# Altium footprint library Samtec PC104 Plus.PcbLib: 38 footprints (part 3 of 3)
Each footprint in its own frame and in the unit in brackets; x right, y up, seen from the top. Pads: shape width x height; smd on the part's side, far side on the other; paste and mask are expansions set on the pad; w line width, h text height; cw(c..) or ccw(c..) is an arc to the next point about the centre after c.
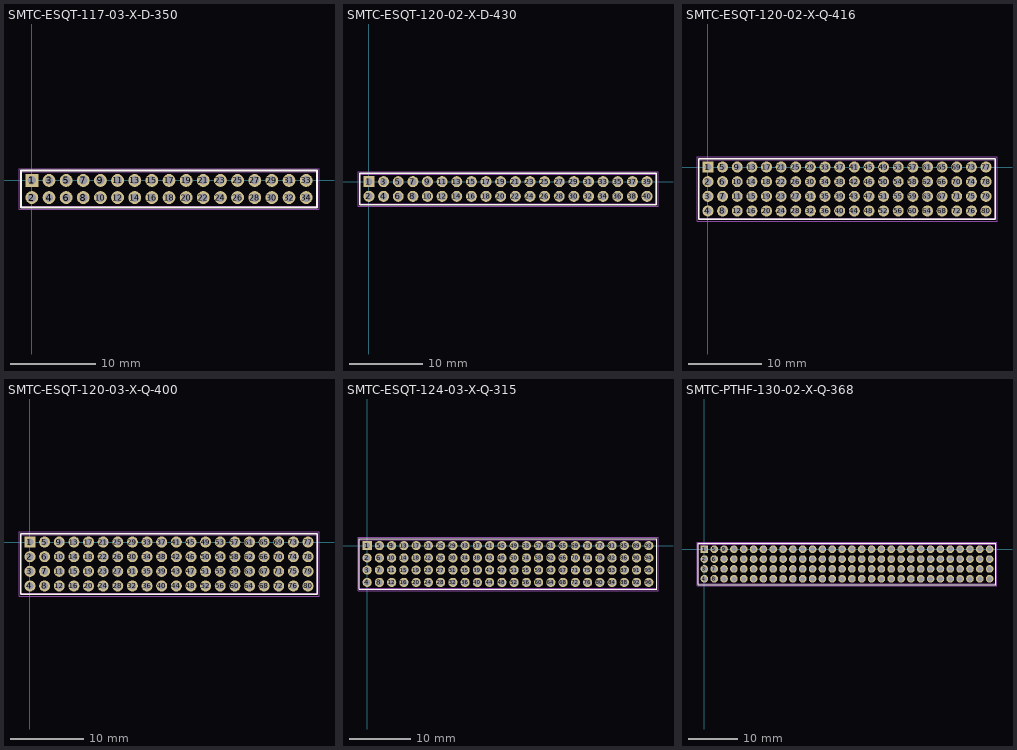
[diagram p2: the footprints below, top view; thin cyan lines are the x and y axes]

## SMTC-ESQT-117-03-X-D-350 [mm] "Flexible Elevated Socket, 2x17 Pins, Vertical, 2mm Pitch, Female"
height 10.36
pads (34):
  rect 1.5x1.5 hole 0.99: 1(0,0)
  round 1.5 hole 0.99: 2(0,-2) 3(2,0) 4(2,-2) 5(4,0) 6(4,-2) 7(6,0) 8(6,-2) 9(8,0) 10(8,-2) 11(10,0) 12(10,-2) 13(12,0) 14(12,-2) 15(14,0) 16(14,-2) 17(16,0) 18(16,-2) 19(18,0) 20(18,-2) 21(20,0) 22(20,-2) 23(22,0) 24(22,-2) 25(24,0) 26(24,-2) 27(26,0) 28(26,-2) 29(28,0) 30(28,-2) 31(30,0) 32(30,-2) 33(32,0) 34(32,-2)
Top Overlay:
  lines w0.2: -1.275,-3.15 -1.275,1.15 33.275,1.15 33.275,-3.15 -1.275,-3.15
Mechanical 13:
  lines w0.1: -1.275,-3 -1.275,1 33.275,1 33.275,-3 -1.275,-3
Mechanical 15:
  lines w0.05: -1.5,-3.375 33.5,-3.375 33.5,1.375 -1.5,1.375 -1.5,-3.375
3D body "ESQT-117-03-X-D-350.step": height 10.36, standoff -2.74, extent -1.149,-3 33.149,1

## SMTC-ESQT-120-02-X-D-430 [mm] "Flexible Elevated Socket, 2x20 Pins, Vertical, 2mm Pitch, Female"
height 20.32
pads (40):
  rect 1.5x1.5 hole 0.99: 1(0,0)
  round 1.5 hole 0.99: 2(0,-2) 3(2,0) 4(2,-2) 5(4,0) 6(4,-2) 7(6,0) 8(6,-2) 9(8,0) 10(8,-2) 11(10,0) 12(10,-2) 13(12,0) 14(12,-2) 15(14,0) 16(14,-2) 17(16,0) 18(16,-2) 19(18,0) 20(18,-2) 21(20,0) 22(20,-2) 23(22,0) 24(22,-2) 25(24,0) 26(24,-2) 27(26,0) 28(26,-2) 29(28,0) 30(28,-2) 31(30,0) 32(30,-2) 33(32,0) 34(32,-2) 35(34,0) 36(34,-2) 37(36,0) 38(36,-2) 39(38,0) 40(38,-2)
Top Overlay:
  lines w0.2: -1.275,-3.15 -1.275,1.15 39.275,1.15 39.275,-3.15 -1.275,-3.15
Mechanical 13:
  lines w0.1: -1.275,-3 39.275,-3 39.275,1 -1.275,1 -1.275,-3
Mechanical 15:
  lines w0.05: -1.5,-3.375 -1.5,1.375 39.5,1.375 39.5,-3.375 -1.5,-3.375
3D body "ESQT-120-02-X-D-430.step": height 20.32, standoff -10.67, extent -1.149,-3 39.149,1

## SMTC-ESQT-120-02-X-Q-416 [mm] "Flexible Elevated Socket, 4x20 Pins, Vertical, 2mm Pitch, Female"
height 20.32
pads (80):
  rect 1.5x1.5 hole 0.99: 1(0,0)
  round 1.5 hole 0.99: 2(0,-2) 3(0,-4) 4(0,-6) 5(2,0) 6(2,-2) 7(2,-4) 8(2,-6) 9(4,0) 10(4,-2) 11(4,-4) 12(4,-6) 13(6,0) 14(6,-2) 15(6,-4) 16(6,-6) 17(8,0) 18(8,-2) 19(8,-4) 20(8,-6) 21(10,0) 22(10,-2) 23(10,-4) 24(10,-6) 25(12,0) 26(12,-2) 27(12,-4) 28(12,-6) 29(14,0) 30(14,-2) 31(14,-4) 32(14,-6) 33(16,0) 34(16,-2) 35(16,-4) 36(16,-6) 37(18,0) 38(18,-2) 39(18,-4) 40(18,-6) 41(20,0) 42(20,-2) 43(20,-4) 44(20,-6) 45(22,0) 46(22,-2) 47(22,-4) 48(22,-6) 49(24,0) 50(24,-2) 51(24,-4) 52(24,-6) 53(26,0) 54(26,-2) 55(26,-4) 56(26,-6) 57(28,0) 58(28,-2) 59(28,-4) 60(28,-6) 61(30,0) 62(30,-2) 63(30,-4) 64(30,-6) 65(32,0) 66(32,-2) 67(32,-4) 68(32,-6) 69(34,0) 70(34,-2) 71(34,-4) 72(34,-6) 73(36,0) 74(36,-2) 75(36,-4) 76(36,-6) 77(38,0) 78(38,-2) 79(38,-4) 80(38,-6)
Top Overlay:
  lines w0.2: -1.275,-7.15 -1.275,1.15 39.275,1.15 39.275,-7.15 -1.275,-7.15
Mechanical 13:
  lines w0.1: -1.275,-7 39.275,-7 39.275,1 -1.275,1 -1.275,-7
Mechanical 15:
  lines w0.05: -1.5,-7.375 39.5,-7.375 39.5,1.375 -1.5,1.375 -1.5,-7.375
3D body "ESQT-120-02-X-Q-416.step": height 20.32, standoff -11.02, extent -1.149,-7 39.149,1

## SMTC-ESQT-120-03-X-Q-400 [mm] "Flexible Elevated Socket, 4x20 Pins, Vertical, 2mm Pitch, Female"
height 10.36
pads (80):
  rect 1.5x1.5 hole 0.99: 1(0,0)
  round 1.5 hole 0.99: 2(0,-2) 3(0,-4) 4(0,-6) 5(2,0) 6(2,-2) 7(2,-4) 8(2,-6) 9(4,0) 10(4,-2) 11(4,-4) 12(4,-6) 13(6,0) 14(6,-2) 15(6,-4) 16(6,-6) 17(8,0) 18(8,-2) 19(8,-4) 20(8,-6) 21(10,0) 22(10,-2) 23(10,-4) 24(10,-6) 25(12,0) 26(12,-2) 27(12,-4) 28(12,-6) 29(14,0) 30(14,-2) 31(14,-4) 32(14,-6) 33(16,0) 34(16,-2) 35(16,-4) 36(16,-6) 37(18,0) 38(18,-2) 39(18,-4) 40(18,-6) 41(20,0) 42(20,-2) 43(20,-4) 44(20,-6) 45(22,0) 46(22,-2) 47(22,-4) 48(22,-6) 49(24,0) 50(24,-2) 51(24,-4) 52(24,-6) 53(26,0) 54(26,-2) 55(26,-4) 56(26,-6) 57(28,0) 58(28,-2) 59(28,-4) 60(28,-6) 61(30,0) 62(30,-2) 63(30,-4) 64(30,-6) 65(32,0) 66(32,-2) 67(32,-4) 68(32,-6) 69(34,0) 70(34,-2) 71(34,-4) 72(34,-6) 73(36,0) 74(36,-2) 75(36,-4) 76(36,-6) 77(38,0) 78(38,-2) 79(38,-4) 80(38,-6)
Top Overlay:
  lines w0.2: -1.275,-7.15 39.275,-7.15 39.275,1.15 -1.275,1.15 -1.275,-7.15
Mechanical 13:
  lines w0.1: -1.275,-7 -1.275,1 39.275,1 39.275,-7 -1.275,-7
Mechanical 15:
  lines w0.05: -1.5,-7.375 39.5,-7.375 39.5,1.375 -1.5,1.375 -1.5,-7.375
3D body "ESQT-120-03-X-Q-400.step": height 10.36, standoff -1.47, extent -1.149,-7 39.148,1

## SMTC-ESQT-124-03-X-Q-315 [mm] "Flexible Elevated Socket, 4x24 Pins, Vertical, 2mm Pitch, Female"
height 10.36
pads (96):
  rect 1.5x1.5 hole 0.99: 1(0,0)
  round 1.5 hole 0.99: 2(0,-2) 3(0,-4) 4(0,-6) 5(2,0) 6(2,-2) 7(2,-4) 8(2,-6) 9(4,0) 10(4,-2) 11(4,-4) 12(4,-6) 13(6,0) 14(6,-2) 15(6,-4) 16(6,-6) 17(8,0) 18(8,-2) 19(8,-4) 20(8,-6) 21(10,0) 22(10,-2) 23(10,-4) 24(10,-6) 25(12,0) 26(12,-2) 27(12,-4) 28(12,-6) 29(14,0) 30(14,-2) 31(14,-4) 32(14,-6) 33(16,0) 34(16,-2) 35(16,-4) 36(16,-6) 37(18,0) 38(18,-2) 39(18,-4) 40(18,-6) 41(20,0) 42(20,-2) 43(20,-4) 44(20,-6) 45(22,0) 46(22,-2) 47(22,-4) 48(22,-6) 49(24,0) 50(24,-2) 51(24,-4) 52(24,-6) 53(26,0) 54(26,-2) 55(26,-4) 56(26,-6) 57(28,0) 58(28,-2) 59(28,-4) 60(28,-6) 61(30,0) 62(30,-2) 63(30,-4) 64(30,-6) 65(32,0) 66(32,-2) 67(32,-4) 68(32,-6) 69(34,0) 70(34,-2) 71(34,-4) 72(34,-6) 73(36,0) 74(36,-2) 75(36,-4) 76(36,-6) 77(38,0) 78(38,-2) 79(38,-4) 80(38,-6) 81(40,0) 82(40,-2) 83(40,-4) 84(40,-6) 85(42,0) 86(42,-2) 87(42,-4) 88(42,-6) 89(44,0) 90(44,-2) 91(44,-4) 92(44,-6) 93(46,0) 94(46,-2) 95(46,-4) 96(46,-6)
Top Overlay:
  lines w0.2: -1.275,-7.15 47.275,-7.15 47.275,1.15 -1.275,1.15 -1.275,-7.15
Mechanical 13:
  lines w0.1: 47.275,-7 -1.275,-7 -1.275,1 47.275,1
Mechanical 15:
  lines w0.05: -1.5,-7.375 47.5,-7.375 47.5,1.375 -1.5,1.375 -1.5,-7.375
3D body "ESQT-124-03-X-Q-315.step": height 10.36, standoff -3.63, extent -1.149,-7 47.149,1

## SMTC-PTHF-130-02-X-Q-368 [mm] "Self-Nesting Sockets, 4x30 Pins, Vertical, 2mm Pitch, Female"
height 11.937
pads (120):
  rect 1.55x1.55 hole 1.016: 1(0,0)
  round 1.55 hole 1.016: 2(0,-2) 3(0,-4) 4(0,-6) 5(2,0) 6(2,-2) 7(2,-4) 8(2,-6) 9(4,0) 10(4,-2) 11(4,-4) 12(4,-6) 13(6,0) 14(6,-2) 15(6,-4) 16(6,-6) 17(8,0) 18(8,-2) 19(8,-4) 20(8,-6) 21(10,0) 22(10,-2) 23(10,-4) 24(10,-6) 25(12,0) 26(12,-2) 27(12,-4) 28(12,-6) 29(14,0) 30(14,-2) 31(14,-4) 32(14,-6) 33(16,0) 34(16,-2) 35(16,-4) 36(16,-6) 37(18,0) 38(18,-2) 39(18,-4) 40(18,-6) 41(20,0) 42(20,-2) 43(20,-4) 44(20,-6) 45(22,0) 46(22,-2) 47(22,-4) 48(22,-6) 49(24,0) 50(24,-2) 51(24,-4) 52(24,-6) 53(26,0) 54(26,-2) 55(26,-4) 56(26,-6) 57(28,0) 58(28,-2) 59(28,-4) 60(28,-6) 61(30,0) 62(30,-2) 63(30,-4) 64(30,-6) 65(32,0) 66(32,-2) 67(32,-4) 68(32,-6) 69(34,0) 70(34,-2) 71(34,-4) 72(34,-6) 73(36,0) 74(36,-2) 75(36,-4) 76(36,-6) 77(38,0) 78(38,-2) 79(38,-4) 80(38,-6) 81(40,0) 82(40,-2) 83(40,-4) 84(40,-6) 85(42,0) 86(42,-2) 87(42,-4) 88(42,-6) 89(44,0) 90(44,-2) 91(44,-4) 92(44,-6) 93(46,0) 94(46,-2) 95(46,-4) 96(46,-6) 97(48,0) 98(48,-2) 99(48,-4) 100(48,-6) 101(50,0) 102(50,-2) 103(50,-4) 104(50,-6) 105(52,0) 106(52,-2) 107(52,-4) 108(52,-6) 109(54,0) 110(54,-2) 111(54,-4) 112(54,-6) 113(56,0) 114(56,-2) 115(56,-4) 116(56,-6) 117(58,0) 118(58,-2) 119(58,-4) 120(58,-6)
Top Overlay:
  lines w0.2: -1.276,-7.175 59.276,-7.175 59.276,1.175 -1.276,1.175 -1.276,-7.175
Mechanical 13:
  lines w0.1: -1.276,-7 59.276,-7 59.276,1 -1.276,1 -1.276,-7
Mechanical 15:
  lines w0.05: -1.501,-7.4 -1.501,1.4 59.501,1.4 59.501,-7.4 -1.501,-7.4
3D body "PTHF-130-02-X-Q-368.step": height 11.94, standoff -9.65, extent -1,-7 59,1.001